# Altium footprint library 20210518.PcbLib: 414 footprints (part 6 of 26)
Each footprint in its own frame and in the unit in brackets; x right, y up, seen from the top. Pads: shape width x height; smd on the part's side, far side on the other; paste and mask are expansions set on the pad; w line width, h text height; cw(c..) or ccw(c..) is an arc to the next point about the centre after c.
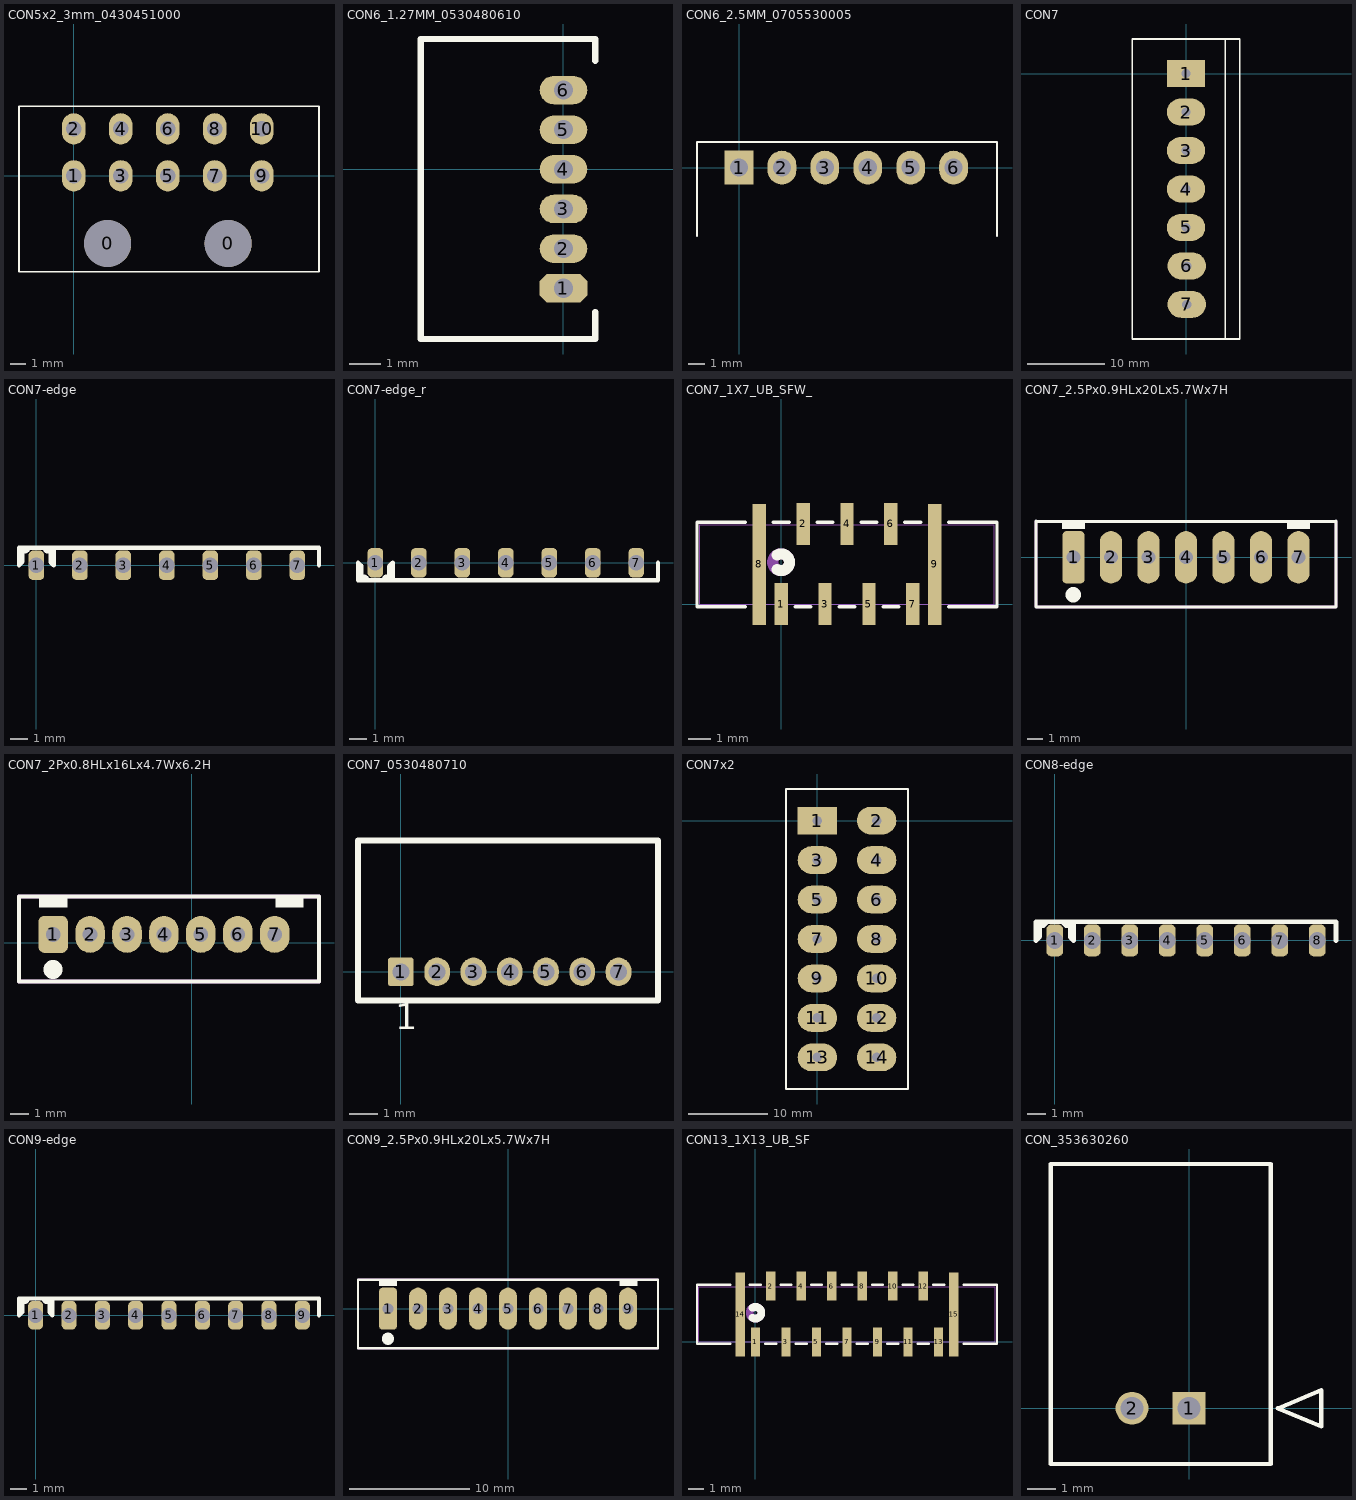
[diagram p5: the footprints below, top view; thin cyan lines are the x and y axes]

## CON5x2_3mm_0430451000 [mm] "Connector Header Through Hole, Right Angle 10 position 0.118\" (3.00mm)"
height 8.5
pads (12):
  round 3 hole 3: 0(2.16,-4.32) 0(9.86,-4.32)
  oval 1.5x2 hole 1: 1(0,0) 2(0,3) 3(3,0) 4(3,3) 5(6,0) 6(6,3) 7(9,0) 8(9,3) 9(12,0) 10(12,3)
Top Overlay:
  lines w0.1: -3.5,-6.13 -3.5,4.45 15.66,4.45 15.66,-6.13 -3.5,-6.13
3D body: height 8.23, standoff -3.72, extent -3.495,-8.955 15.655,3.285

## CON6_1.27MM_0530480610 [mm]
pads (6):
  oct 1.5x0.9 hole 0.6: 1(0,-3.75)
  oval 1.5x0.9 hole 0.6: 2(0,-2.5) 3(0,-1.25) 4(0,0) 5(0,1.25) 6(0,2.5)
Top Overlay:
  lines w0.2: 1,-4.5 1,-5.35 -4.5,-5.35 -4.5,4.11 1,4.11 1,3.42
3D body: height 3.6, standoff -2.2, extent -4.465,-5.245 1.035,4.005

## CON6_2.5MM_0705530005 [mm] "Connector Header Through Hole, Right Angle 6 position 0.100\" (2.54mm)"
pads (6):
  rect 1.7x2 hole 1.07: 1(0,0)
  oval 1.7x2 hole 1.07: 2(2.54,0) 3(5.08,0) 4(7.62,0) 5(10.16,0) 6(12.7,0)
Top Overlay:
  lines w0.1: -2.49,-4.05 -2.49,1.52 15.27,1.52 15.27,-4.05
3D body: height 7.06, standoff -3.22, extent -2.51,-12.969 15.27,0.62

## CON7 [mm] "5mm aralýklý"
height 15
pads (7):
  rect 5x3.5 hole 1.2: 1(0,0)
  oval 5x3.5 hole 1.2: 2(0,-5) 3(0,-10) 4(0,-15) 5(0,-20) 6(0.1,-25) 7(0.1,-30)
Top Overlay:
  lines w0.2: 5.1,-34.5 5.1,4.5 ; -7,-34.5 7,-34.5 7,4.5 -7,4.5 -7,-34.5

## CON7-edge [mm] "Connector; 7 Position, 2mm pin space, 0.9mm hole,"
pads (7):
  rrect60% 0.9x1.7 hole 0.9: 1(0,0) 2(2.5,0) 3(5,0) 4(7.5,0) 5(10,0) 6(12.5,0) 7(15,0)
Top Overlay:
  lines w0.254: -0.5,0.9 -0.6,0.8 -0.8,0.8 -0.8,0.2 -1,0 ; 0.5,0.9 0.6,0.8 0.8,0.8 ; 0.825,0.8 0.825,0.175 1,0 1,1 ; 16.25,0 16.25,1 -1,1 ; -1,0 -1,1 ; -1,0 -1,1

## CON7-edge_r [mm] "Connector; 7 Position, 2mm pin space, 0.9mm hole,"
pads (7):
  rrect60% 0.9x1.7 hole 0.9: 1(0,0) 2(2.5,0) 3(5,0) 4(7.5,0) 5(10,0) 6(12.5,0) 7(15,0)
Top Overlay:
  lines w0.254: -0.825,-0.8 -0.825,-0.175 -1,0 -1,-1 16.25,-1 16.25,0 ; -0.8,-0.8 -0.6,-0.8 -0.5,-0.9 ; 0.5,-0.9 0.6,-0.8 0.8,-0.8 0.8,-0.2 1,0 1,-1

## CON7_1X7_UB_SFW_ [mil]
pads (9):
  rect 24x75 smd: 1(0,0) 2(39.37,143.7) 3(78.74,0) 4(118.11,143.7) 5(157.48,0) 6(196.85,143.7) 7(236.22,0)
  rect 24x217 smd: 8(-39.37,71) 9(275.59,71)
Top Overlay:
  lines w6: -64.47,-5 -150.89,-5 -150.89,147 -64.47,147 ; -14.27,147 14.27,147 ; 25.1,-5 53.64,-5 ; 64.47,147 93.01,147 ; 103.84,-5 132.38,-5 ; 143.21,147 171.75,147 ; 182.58,-5 211.12,-5 ; 221.95,147 250.49,147 ; 300.69,-5 387.11,-5 387.11,147 300.69,147
  lines w20: -7.27,61.88 ccw(c0,75) 15,75 ccw(c0,75) -7.27,88.12
Bottom Overlay:
  circle w20: c0,75 r15
Outline:
  circle w20: c0,75 r15
  lines w1: -145.89,0 -145.89,142 382.11,142 382.11,0 -145.89,0
3D body: height 210.63, standoff 1.97, extent -78.74,-17.16 314.96,160

## CON7_2.5Px0.9HLx20Lx5.7Wx7H [mm] "Connector; 7 Position, 2.5mm pin space, 0.9mm hole, Body 20x5.7mm, Height 7mm"
height 7
pads (7):
  rrect40% 1.5x3.5 hole 0.9: 1(-7.5,0)
  oval 1.5x3.5 hole 0.9: 2(-5,0) 3(-2.5,0) 4(0,0) 5(2.5,0) 6(5,0) 7(7.5,0)
Top Overlay:
  circle w1: c-7.51,-2.5 r0.01
  rectangle: 6.731,1.9 8.255,2.413
  rectangle: -8.255,1.9 -6.731,2.413
  lines w0.2: -10,-3.302 -10,2.413 ; -10,-3.3 10,-3.3 ; -10,2.4 10,2.4 ; 10,-3.302 10,2.413
Mechanical 13:
  lines w0.2: -10,-3.302 -10,2.413 ; -10,-3.3 10,-3.3 ; -10,2.4 10,2.4 ; 10,-3.302 10,2.413
Mechanical 15:
  lines w0.2: -10,-3.302 -10,2.413 ; -10,-3.3 10,-3.3 ; -10,2.4 10,2.4 ; 10,-3.302 10,2.413
3D body: height 7, standoff -4.9, extent -9.95,-3.245 9.95,2.355

## CON7_2Px0.8HLx16Lx4.7Wx6.2H [mm] "Connector; 7 Position, 2.0mm pin space, 0.8mm hole, Body 16x4.7mm, Height 6.2mm"
height 7
pads (7):
  rrect40% 1.6x2 hole 0.8: 1(-7.5,0.45)
  oval 1.6x2 hole 0.8: 2(-5.5,0.45) 3(-3.5,0.45) 4(-1.5,0.45) 5(0.5,0.45) 6(2.5,0.45) 7(4.5,0.45)
Top Overlay:
  circle w1: c-7.51,-1.45 r0.01
  rectangle: 4.531,1.9 6.055,2.413
  rectangle: -8.255,1.9 -6.731,2.413
  lines w0.2: -9.35,-2.1 6.9,-2.1 6.9,2.5 -9.35,2.5 -9.35,-2.1
Mechanical 13:
  lines w0.2: -9.35,-2.1 6.9,-2.1 6.9,2.5 -9.35,2.5 -9.35,-2.1
Mechanical 15:
  lines w0.2: -9.35,-2.1 6.9,-2.1 6.9,2.5 -9.35,2.5 -9.35,-2.1
3D body: height 6.2, standoff 0, extent 6.8,-2 7,2.4
3D body: height 6.2, standoff 0, extent -9.25,-2.2 7,-2
3D body: height 6.2, standoff 0, extent -6.75,2.4 4.5,2.6
3D body: height 6.2, standoff 0, extent -9.45,-2.2 -9.25,2.6
3D body: height 6.2, standoff 0, extent 6,2.4 7,2.6
3D body: height 2, standoff 0, extent 4.5,2.4 6,2.6
3D body: height 2, standoff 0, extent -8.25,2.4 -6.75,2.6
3D body: height 6.2, standoff 0, extent -9.25,2.4 -8.25,2.6

## CON7_0530480710 [mm] "Connector; Header; 7 Position; 1.27mm pitch - 0530480710"
pads (7):
  rrect20% 0.9x1 hole 0.6: 1(0,0)
  oval 0.9x1 hole 0.6: 2(1.27,0) 3(2.54,0) 4(3.81,0) 5(5.08,0) 6(6.35,0) 7(7.62,0)
Top Overlay:
  lines w0.2: -1.5,-1 -1.5,4.6 9,4.6 9,-1 -1.5,-1
  text "1" at -0.2,-2.3 h1.52
3D body: height 3.6, standoff -2.2, extent -1.45,-1.025 9.05,4.475

## CON7x2 [mm] "5mm aralýklý"
height 15
pads (14):
  rect 5x3.5 hole 1.2: 1(0,0)
  oval 5x3.5 hole 1.2: 2(7.5,0) 3(0,-5) 4(7.5,-5) 5(0,-10) 6(7.5,-10) 7(0,-15) 8(7.5,-15) 9(0,-20) 10(7.5,-20) 11(0,-25) 12(7.5,-25) 13(0,-30) 14(7.5,-30)
Top Overlay:
  lines w0.254: -4,-34 -4,4 11.5,4 11.5,-34 -4,-34

## CON8-edge [mm] "Connector; 8 Position, 2mm pin space, 0.9mm hole,"
pads (8):
  rrect60% 0.9x1.7 hole 0.9: 1(0,0) 2(2,0) 3(4,0) 4(6,0) 5(8,0) 6(10,0) 7(12,0) 8(14,0)
Top Overlay:
  lines w0.254: -0.5,0.9 -0.6,0.8 -0.8,0.8 -0.8,0.2 -1,0 ; 0.5,0.9 0.6,0.8 0.8,0.8 ; 0.825,0.8 0.825,0.175 1,0 1,1 ; 15,0 15,1 -1,1 ; -1,0 -1,1 ; -1,0 -1,1

## CON9-edge [mm] "Connector; 9Position, 2mm pin space, 0.9mm hole,"
pads (9):
  rrect60% 0.9x1.7 hole 0.9: 1(0,0) 2(2,0) 3(4,0) 4(6,0) 5(8,0) 6(10,0) 7(12,0) 8(14,0) 9(16,0)
Top Overlay:
  lines w0.254: -0.5,0.9 -0.6,0.8 -0.8,0.8 -0.8,0.2 -1,0 ; 0.5,0.9 0.6,0.8 0.8,0.8 ; 0.825,0.8 0.825,0.175 1,0 1,1 ; 17,0 17,1 -1,1 ; -1,0 -1,1 ; -1,0 -1,1

## CON9_2.5Px0.9HLx20Lx5.7Wx7H [mm] "Connector; 9 Position, 2.5mm pin space, 0.9mm hole, Body 20x5.7mm, Height 7mm"
height 7
pads (9):
  rrect40% 1.5x3.5 hole 0.9: 1(-10,0)
  oval 1.5x3.5 hole 0.9: 2(-7.5,0) 3(-5,0) 4(-2.5,0) 5(0,0) 6(2.5,0) 7(5,0) 8(7.5,0) 9(10,0)
Top Overlay:
  circle w1: c-10.01,-2.5 r0.01
  rectangle: 9.276,1.9 10.8,2.413
  rectangle: -10.755,1.9 -9.231,2.413
  lines w0.2: -12.5,-3.302 -12.5,2.413 ; -12.5,-3.3 12.5,-3.3 12.5,2.4 -12.5,2.4
Mechanical 13:
  lines w0.2: -12.5,-3.302 -12.5,2.413 ; -12.5,-3.3 12.5,-3.3 12.5,2.4 -12.5,2.4
Mechanical 15:
  lines w0.2: -12.5,-3.302 -12.5,2.413 ; -12.5,-3.3 12.5,-3.3 12.5,2.4 -12.5,2.4
3D body: height 7, standoff -4.9, extent -12.6,-3.2 12.3,2.4

## CON13_1X13_UB_SF [mm]
pads (15):
  rect 0.61x1.905 smd: 1(0,0) 2(1,3.65) 3(2,0) 4(3,3.65) 5(4,0) 6(5,3.65) 7(6,0) 8(7,3.65) 9(8,0) 10(9,3.65) 11(10,0) 12(11,3.65) 13(12,0)
  rect 0.61x5.512 smd: 14(-1,1.803) 15(13,1.803)
Top Overlay:
  lines w0.152: -1.638,-0.127 -3.83,-0.127 -3.83,3.734 -1.638,3.734 ; -0.362,3.734 0.362,3.734 ; 0.638,-0.127 1.362,-0.127 ; 1.638,3.734 2.362,3.734 ; 2.638,-0.127 3.362,-0.127 ; 3.638,3.734 4.362,3.734 ; 4.638,-0.127 5.362,-0.127 ; 5.638,3.734 6.362,3.734 ; 6.638,-0.127 7.362,-0.127 ; 7.638,3.734 8.362,3.734 ; 8.638,-0.127 9.362,-0.127 ; 9.638,3.734 10.362,3.734 ; 10.638,-0.127 11.362,-0.127 ; 11.638,3.734 12.362,3.734 ; 13.638,-0.127 15.83,-0.127 15.83,3.734 13.638,3.734
  lines w0.508: -0.185,1.572 ccw(c0,1.905) 0.381,1.905 ccw(c0,1.905) -0.185,2.238
Bottom Overlay:
  circle w0.508: c0,1.905 r0.381
Outline:
  circle w0.508: c0,1.905 r0.381
  lines w0.025: -3.703,0 15.703,0 15.703,3.607 -3.703,3.607 -3.703,0
3D body: height 5.3, standoff 0, extent -3.702,-0.35 15.698,4.15

## CON_353630260 [mm]
pads (2):
  rect 1.15x1.15 hole 0.8 mask-25.4: 1(0,0)
  round 1.15 hole 0.8 mask-25.4: 2(-2,0)
Top Overlay:
  lines w0.152: -4.85,-1.95 2.85,-1.95 2.85,8.55 -4.85,8.55 -4.85,-1.95 ; 3.104,0 4.628,-0.635 4.628,0.635 3.104,0
Top Solder:
  region: -2,0.657 -2.17,0.634 -2.328,0.569 -2.464,0.464 -2.569,0.328 -2.634,0.17 -2.657,0 -2.634,-0.17 -2.569,-0.328 -2.464,-0.464 -2.328,-0.569 -2.17,-0.634 -2,-0.657 -1.83,-0.634 -1.672,-0.569 -1.536,-0.464 -1.431,-0.328 -1.366,-0.17 -1.343,0 -1.366,0.17 -1.431,0.328 -1.536,0.464 -1.672,0.569 -1.83,0.634
  region: -0.651,-0.651 0.651,-0.651 0.651,0.651 -0.651,0.651
Bottom Solder:
  region: -2,0.657 -2.17,0.634 -2.328,0.569 -2.464,0.464 -2.569,0.328 -2.634,0.17 -2.657,0 -2.634,-0.17 -2.569,-0.328 -2.464,-0.464 -2.328,-0.569 -2.17,-0.634 -2,-0.657 -1.83,-0.634 -1.672,-0.569 -1.536,-0.464 -1.431,-0.328 -1.366,-0.17 -1.343,0 -1.366,0.17 -1.431,0.328 -1.536,0.464 -1.672,0.569 -1.83,0.634
  region: -0.651,-0.651 0.651,-0.651 0.651,0.651 -0.651,0.651
3D body: height 5.55, standoff -3.15, extent -4.891,-1.907 2.809,8.593